# Altium schematic symbol library jlcpcb_2025_04_capacitors_extended_0402.schlib: 3594 symbols (part 7 of 20) (continued)
## CC0402CRNPO9BN8R0
designator C?  Capacitance: 8pF  (hidden comment: *)
Capacitor, Ceramic (MLCC), 8pF, 50V, NP0, SMD 0402; Manufacturer: YAGEO; Manufacturer Part Number: CC0402CRNPO9BN8R0; Package Size: 0402; JLCPCB Basic Part: No; JLCPCB Part Number: C130118; Supplier 1: LCSC; Category: Capacitors - MLCC; Supplier Part Number 1: C130118; Voltage Rating: 50V; Temperature Coefficient: NP0; RoHS: Yes; ComponentLink1Description: Datasheet; ComponentLink1URL: https://wmsc.lcsc.com/wmsc/upload/file/pdf/v2/lcsc/2304140030_YAGEO-CC0402CRNPO9BN8R0_C130118.pdf; ComponentLink2Description: JLCPCB Part URL; ComponentLink2URL: https://jlcpcb.com/partdetail/C130118; ComponentLink3Description: LCSC Part URL; ComponentLink3URL: https://lcsc.com/product-detail/Multilayer-Ceramic-Capacitors-MLCC---SMD-SMT_YAGEO-YAGEO-CC0402CRNPO9BN8R0_C130118.html
footprint CAP-0402 (0402 (1005M) Capacitor)
pins: 1, 2

## CC0402CRNPO9BN8R2
designator C?  Capacitance: 8.2pF  (hidden comment: *)
Capacitor, Ceramic (MLCC), 8.2pF, 50V, NP0, SMD 0402; Manufacturer: YAGEO; Manufacturer Part Number: CC0402CRNPO9BN8R2; Package Size: 0402; JLCPCB Basic Part: No; JLCPCB Part Number: C260529; Supplier 1: LCSC; Category: Capacitors - MLCC; Supplier Part Number 1: C260529; Voltage Rating: 50V; Temperature Coefficient: NP0; RoHS: Yes; ComponentLink1Description: Datasheet; ComponentLink1URL: https://wmsc.lcsc.com/wmsc/upload/file/pdf/v2/lcsc/1810241331_YAGEO-CC0402CRNPO9BN8R2_C260529.pdf; ComponentLink2Description: JLCPCB Part URL; ComponentLink2URL: https://jlcpcb.com/partdetail/C260529; ComponentLink3Description: LCSC Part URL; ComponentLink3URL: https://lcsc.com/product-detail/Multilayer-Ceramic-Capacitors-MLCC---SMD-SMT_YAGEO-YAGEO-CC0402CRNPO9BN8R2_C260529.html
footprint CAP-0402 (0402 (1005M) Capacitor)
pins: 1, 2

## CC0402CRNPO9BN9R0
designator C?  Capacitance: 9pF  (hidden comment: *)
Capacitor, Ceramic (MLCC), 9pF, 50V, NP0, SMD 0402; Manufacturer: YAGEO; Manufacturer Part Number: CC0402CRNPO9BN9R0; Package Size: 0402; JLCPCB Basic Part: No; JLCPCB Part Number: C282242; Supplier 1: LCSC; Category: Capacitors - MLCC; Supplier Part Number 1: C282242; Voltage Rating: 50V; Temperature Coefficient: NP0; RoHS: Yes; ComponentLink1Description: Datasheet; ComponentLink1URL: https://wmsc.lcsc.com/wmsc/upload/file/pdf/v2/lcsc/2304140030_YAGEO-CC0402CRNPO9BN9R0_C282242.pdf; ComponentLink2Description: JLCPCB Part URL; ComponentLink2URL: https://jlcpcb.com/partdetail/C282242; ComponentLink3Description: LCSC Part URL; ComponentLink3URL: https://lcsc.com/product-detail/Multilayer-Ceramic-Capacitors-MLCC---SMD-SMT_YAGEO-YAGEO-CC0402CRNPO9BN9R0_C282242.html
footprint CAP-0402 (0402 (1005M) Capacitor)
pins: 1, 2

## CC0402CRNPO9BN9R1
designator C?  Capacitance: 9.1pF  (hidden comment: *)
Capacitor, Ceramic (MLCC), 9.1pF, 50V, NP0, SMD 0402; Manufacturer: YAGEO; Manufacturer Part Number: CC0402CRNPO9BN9R1; Package Size: 0402; JLCPCB Basic Part: No; JLCPCB Part Number: C513622; Supplier 1: LCSC; Category: Capacitors - MLCC; Supplier Part Number 1: C513622; Voltage Rating: 50V; Temperature Coefficient: NP0; RoHS: Yes; ComponentLink1Description: Datasheet; ComponentLink1URL: https://wmsc.lcsc.com/wmsc/upload/file/pdf/v2/lcsc/2004231433_YAGEO-CC0402CRNPO9BN9R1_C513622.pdf; ComponentLink2Description: JLCPCB Part URL; ComponentLink2URL: https://jlcpcb.com/partdetail/C513622; ComponentLink3Description: LCSC Part URL; ComponentLink3URL: https://lcsc.com/product-detail/Multilayer-Ceramic-Capacitors-MLCC---SMD-SMT_YAGEO-YAGEO-CC0402CRNPO9BN9R1_C513622.html
footprint CAP-0402 (0402 (1005M) Capacitor)
pins: 1, 2

## CC0402CRNPO9BN100
designator C?  Capacitance: 10pF  (hidden comment: *)
Capacitor, Ceramic (MLCC), 10pF, 50V, NP0, SMD 0402; Manufacturer: YAGEO; Manufacturer Part Number: CC0402CRNPO9BN100; Package Size: 0402; JLCPCB Basic Part: No; JLCPCB Part Number: C526974; Supplier 1: LCSC; Category: Capacitors - MLCC; Supplier Part Number 1: C526974; Voltage Rating: 50V; Temperature Coefficient: NP0; RoHS: Yes; ComponentLink1Description: Datasheet; ComponentLink1URL: https://wmsc.lcsc.com/wmsc/upload/file/pdf/v2/lcsc/2005141733_YAGEO-CC0402CRNPO9BN100_C526974.pdf; ComponentLink2Description: JLCPCB Part URL; ComponentLink2URL: https://jlcpcb.com/partdetail/C526974; ComponentLink3Description: LCSC Part URL; ComponentLink3URL: https://lcsc.com/product-detail/Multilayer-Ceramic-Capacitors-MLCC---SMD-SMT_YAGEO-YAGEO-CC0402CRNPO9BN100_C526974.html
footprint CAP-0402 (0402 (1005M) Capacitor)
pins: 1, 2

## CC0402CRNPO9BNR47
designator C?  Capacitance: 0.47pF  (hidden comment: *)
Capacitor, Ceramic (MLCC), 0.47pF, 50V, NP0, SMD 0402; Manufacturer: YAGEO; Manufacturer Part Number: CC0402CRNPO9BNR47; Package Size: 0402; JLCPCB Basic Part: No; JLCPCB Part Number: C526975; Supplier 1: LCSC; Category: Capacitors - MLCC; Supplier Part Number 1: C526975; Voltage Rating: 50V; Temperature Coefficient: NP0; RoHS: Yes; ComponentLink1Description: Datasheet; ComponentLink1URL: https://wmsc.lcsc.com/wmsc/upload/file/pdf/v2/lcsc/2006031834_YAGEO-CC0402CRNPO9BNR47_C526975.pdf; ComponentLink2Description: JLCPCB Part URL; ComponentLink2URL: https://jlcpcb.com/partdetail/C526975; ComponentLink3Description: LCSC Part URL; ComponentLink3URL: https://lcsc.com/product-detail/Multilayer-Ceramic-Capacitors-MLCC---SMD-SMT_YAGEO-YAGEO-CC0402CRNPO9BNR47_C526975.html
footprint CAP-0402 (0402 (1005M) Capacitor)
pins: 1, 2

## CC0402CRNPO9BNR50
designator C?  Capacitance: 0.5pF  (hidden comment: *)
Capacitor, Ceramic (MLCC), 0.5pF, 50V, NP0, SMD 0402; Manufacturer: YAGEO; Manufacturer Part Number: CC0402CRNPO9BNR50; Package Size: 0402; JLCPCB Basic Part: No; JLCPCB Part Number: C327230; Supplier 1: LCSC; Category: Capacitors - MLCC; Supplier Part Number 1: C327230; Voltage Rating: 50V; Temperature Coefficient: NP0; RoHS: Yes; ComponentLink1Description: Datasheet; ComponentLink1URL: https://wmsc.lcsc.com/wmsc/upload/file/pdf/v2/lcsc/1811141233_YAGEO-CC0402CRNPO9BNR50_C327230.pdf; ComponentLink2Description: JLCPCB Part URL; ComponentLink2URL: https://jlcpcb.com/partdetail/C327230; ComponentLink3Description: LCSC Part URL; ComponentLink3URL: https://lcsc.com/product-detail/Multilayer-Ceramic-Capacitors-MLCC---SMD-SMT_YAGEO-YAGEO-CC0402CRNPO9BNR50_C327230.html
footprint CAP-0402 (0402 (1005M) Capacitor)
pins: 1, 2

## CC0402CRNPO9BNR56
designator C?  Capacitance: 0.56pF  (hidden comment: *)
Capacitor, Ceramic (MLCC), 0.56pF, 50V, NP0, SMD 0402; Manufacturer: YAGEO; Manufacturer Part Number: CC0402CRNPO9BNR56; Package Size: 0402; JLCPCB Basic Part: No; JLCPCB Part Number: C114396; Supplier 1: LCSC; Category: Capacitors - MLCC; Supplier Part Number 1: C114396; Voltage Rating: 50V; Temperature Coefficient: NP0; RoHS: Yes; ComponentLink1Description: Datasheet; ComponentLink1URL: https://wmsc.lcsc.com/wmsc/upload/file/pdf/v2/lcsc/2304140030_YAGEO-CC0402CRNPO9BNR56_C114396.pdf; ComponentLink2Description: JLCPCB Part URL; ComponentLink2URL: https://jlcpcb.com/partdetail/C114396; ComponentLink3Description: LCSC Part URL; ComponentLink3URL: https://lcsc.com/product-detail/Multilayer-Ceramic-Capacitors-MLCC---SMD-SMT_YAGEO-YAGEO-CC0402CRNPO9BNR56_C114396.html
footprint CAP-0402 (0402 (1005M) Capacitor)
pins: 1, 2

## CC0402CRNPO9BNR68
designator C?  Capacitance: 0.68pF  (hidden comment: *)
Capacitor, Ceramic (MLCC), 0.68pF, 50V, NP0, SMD 0402; Manufacturer: YAGEO; Manufacturer Part Number: CC0402CRNPO9BNR68; Package Size: 0402; JLCPCB Basic Part: No; JLCPCB Part Number: C281749; Supplier 1: LCSC; Category: Capacitors - MLCC; Supplier Part Number 1: C281749; Voltage Rating: 50V; Temperature Coefficient: NP0; RoHS: Yes; ComponentLink1Description: Datasheet; ComponentLink1URL: https://wmsc.lcsc.com/wmsc/upload/file/pdf/v2/lcsc/2304140030_YAGEO-CC0402CRNPO9BNR68_C281749.pdf; ComponentLink2Description: JLCPCB Part URL; ComponentLink2URL: https://jlcpcb.com/partdetail/C281749; ComponentLink3Description: LCSC Part URL; ComponentLink3URL: https://lcsc.com/product-detail/Multilayer-Ceramic-Capacitors-MLCC---SMD-SMT_YAGEO-YAGEO-CC0402CRNPO9BNR68_C281749.html
footprint CAP-0402 (0402 (1005M) Capacitor)
pins: 1, 2

## CC0402CRNPO9BNR70
designator C?  Capacitance: 0.7pF  (hidden comment: *)
Capacitor, Ceramic (MLCC), 0.7pF, 50V, NP0, SMD 0402; Manufacturer: YAGEO; Manufacturer Part Number: CC0402CRNPO9BNR70; Package Size: 0402; JLCPCB Basic Part: No; JLCPCB Part Number: C541353; Supplier 1: LCSC; Category: Capacitors - MLCC; Supplier Part Number 1: C541353; Voltage Rating: 50V; Temperature Coefficient: NP0; RoHS: Yes; ComponentLink1Description: Datasheet; ComponentLink1URL: https://wmsc.lcsc.com/wmsc/upload/file/pdf/v2/lcsc/2006151111_YAGEO-CC0402CRNPO9BNR70_C541353.pdf; ComponentLink2Description: JLCPCB Part URL; ComponentLink2URL: https://jlcpcb.com/partdetail/C541353; ComponentLink3Description: LCSC Part URL; ComponentLink3URL: https://lcsc.com/product-detail/Multilayer-Ceramic-Capacitors-MLCC---SMD-SMT_YAGEO-YAGEO-CC0402CRNPO9BNR70_C541353.html
footprint CAP-0402 (0402 (1005M) Capacitor)
pins: 1, 2

## CC0402CRNPO9BNR75
designator C?  Capacitance: 0.75pF  (hidden comment: *)
Capacitor, Ceramic (MLCC), 0.75pF, 50V, NP0, SMD 0402; Manufacturer: YAGEO; Manufacturer Part Number: CC0402CRNPO9BNR75; Package Size: 0402; JLCPCB Basic Part: No; JLCPCB Part Number: C325457; Supplier 1: LCSC; Category: Capacitors - MLCC; Supplier Part Number 1: C325457; Voltage Rating: 50V; Temperature Coefficient: NP0; RoHS: Yes; ComponentLink1Description: Datasheet; ComponentLink1URL: https://wmsc.lcsc.com/wmsc/upload/file/pdf/v2/lcsc/1811070918_YAGEO-CC0402CRNPO9BNR75_C325457.pdf; ComponentLink2Description: JLCPCB Part URL; ComponentLink2URL: https://jlcpcb.com/partdetail/C325457; ComponentLink3Description: LCSC Part URL; ComponentLink3URL: https://lcsc.com/product-detail/Multilayer-Ceramic-Capacitors-MLCC---SMD-SMT_YAGEO-YAGEO-CC0402CRNPO9BNR75_C325457.html
footprint CAP-0402 (0402 (1005M) Capacitor)
pins: 1, 2

## CC0402CRNPO9BNR80
designator C?  Capacitance: 0.8pF  (hidden comment: *)
Capacitor, Ceramic (MLCC), 0.8pF, 50V, NP0, SMD 0402; Manufacturer: YAGEO; Manufacturer Part Number: CC0402CRNPO9BNR80; Package Size: 0402; JLCPCB Basic Part: No; JLCPCB Part Number: C325458; Supplier 1: LCSC; Category: Capacitors - MLCC; Supplier Part Number 1: C325458; Voltage Rating: 50V; Temperature Coefficient: NP0; RoHS: Yes; ComponentLink1Description: Datasheet; ComponentLink1URL: https://wmsc.lcsc.com/wmsc/upload/file/pdf/v2/lcsc/1811070918_YAGEO-CC0402CRNPO9BNR80_C325458.pdf; ComponentLink2Description: JLCPCB Part URL; ComponentLink2URL: https://jlcpcb.com/partdetail/C325458; ComponentLink3Description: LCSC Part URL; ComponentLink3URL: https://lcsc.com/product-detail/Multilayer-Ceramic-Capacitors-MLCC---SMD-SMT_YAGEO-YAGEO-CC0402CRNPO9BNR80_C325458.html
footprint CAP-0402 (0402 (1005M) Capacitor)
pins: 1, 2

## CC0402CRNPO9BNR82
designator C?  Capacitance: 0.82pF  (hidden comment: *)
Capacitor, Ceramic (MLCC), 0.82pF, 50V, NP0, SMD 0402; Manufacturer: YAGEO; Manufacturer Part Number: CC0402CRNPO9BNR82; Package Size: 0402; JLCPCB Basic Part: No; JLCPCB Part Number: C541346; Supplier 1: LCSC; Category: Capacitors - MLCC; Supplier Part Number 1: C541346; Voltage Rating: 50V; Temperature Coefficient: NP0; RoHS: Yes; ComponentLink1Description: Datasheet; ComponentLink1URL: https://wmsc.lcsc.com/wmsc/upload/file/pdf/v2/lcsc/2006151111_YAGEO-CC0402CRNPO9BNR82_C541346.pdf; ComponentLink2Description: JLCPCB Part URL; ComponentLink2URL: https://jlcpcb.com/partdetail/C541346; ComponentLink3Description: LCSC Part URL; ComponentLink3URL: https://lcsc.com/product-detail/Multilayer-Ceramic-Capacitors-MLCC---SMD-SMT_YAGEO-YAGEO-CC0402CRNPO9BNR82_C541346.html
footprint CAP-0402 (0402 (1005M) Capacitor)
pins: 1, 2

## CC0402DRNPO8BN100
designator C?  Capacitance: 10pF  (hidden comment: *)
Capacitor, Ceramic (MLCC), 10pF, 25V, NP0, SMD 0402; Manufacturer: YAGEO; Manufacturer Part Number: CC0402DRNPO8BN100; Package Size: 0402; JLCPCB Basic Part: No; JLCPCB Part Number: C526976; Supplier 1: LCSC; Category: Capacitors - MLCC; Supplier Part Number 1: C526976; Voltage Rating: 25V; Temperature Coefficient: NP0; RoHS: Yes; ComponentLink1Description: Datasheet; ComponentLink1URL: https://wmsc.lcsc.com/wmsc/upload/file/pdf/v2/lcsc/2005261832_YAGEO-CC0402DRNPO8BN100_C526976.pdf; ComponentLink2Description: JLCPCB Part URL; ComponentLink2URL: https://jlcpcb.com/partdetail/C526976; ComponentLink3Description: LCSC Part URL; ComponentLink3URL: https://lcsc.com/product-detail/Multilayer-Ceramic-Capacitors-MLCC---SMD-SMT_YAGEO-YAGEO-CC0402DRNPO8BN100_C526976.html
footprint CAP-0402 (0402 (1005M) Capacitor)
pins: 1, 2

## CC0402DRNPO9BN5R0
designator C?  Capacitance: 5pF  (hidden comment: *)
Capacitor, Ceramic (MLCC), 5pF, 50V, NP0, SMD 0402; Manufacturer: YAGEO; Manufacturer Part Number: CC0402DRNPO9BN5R0; Package Size: 0402; JLCPCB Basic Part: No; JLCPCB Part Number: C281762; Supplier 1: LCSC; Category: Capacitors - MLCC; Supplier Part Number 1: C281762; Voltage Rating: 50V; Temperature Coefficient: NP0; RoHS: Yes; ComponentLink1Description: Datasheet; ComponentLink1URL: https://wmsc.lcsc.com/wmsc/upload/file/pdf/v2/lcsc/2304140030_YAGEO-CC0402DRNPO9BN5R0_C281762.pdf; ComponentLink2Description: JLCPCB Part URL; ComponentLink2URL: https://jlcpcb.com/partdetail/C281762; ComponentLink3Description: LCSC Part URL; ComponentLink3URL: https://lcsc.com/product-detail/Multilayer-Ceramic-Capacitors-MLCC---SMD-SMT_YAGEO-YAGEO-CC0402DRNPO9BN5R0_C281762.html
footprint CAP-0402 (0402 (1005M) Capacitor)
pins: 1, 2

## CC0402DRNPO9BN5R1
designator C?  Capacitance: 5.1pF  (hidden comment: *)
Capacitor, Ceramic (MLCC), 5.1pF, 50V, NP0, SMD 0402; Manufacturer: YAGEO; Manufacturer Part Number: CC0402DRNPO9BN5R1; Package Size: 0402; JLCPCB Basic Part: No; JLCPCB Part Number: C541354; Supplier 1: LCSC; Category: Capacitors - MLCC; Supplier Part Number 1: C541354; Voltage Rating: 50V; Temperature Coefficient: NP0; RoHS: Yes; ComponentLink1Description: Datasheet; ComponentLink1URL: https://wmsc.lcsc.com/wmsc/upload/file/pdf/v2/lcsc/2006151111_YAGEO-CC0402DRNPO9BN5R1_C541354.pdf; ComponentLink2Description: JLCPCB Part URL; ComponentLink2URL: https://jlcpcb.com/partdetail/C541354; ComponentLink3Description: LCSC Part URL; ComponentLink3URL: https://lcsc.com/product-detail/Multilayer-Ceramic-Capacitors-MLCC---SMD-SMT_YAGEO-YAGEO-CC0402DRNPO9BN5R1_C541354.html
footprint CAP-0402 (0402 (1005M) Capacitor)
pins: 1, 2

## CC0402DRNPO9BN5R6
designator C?  Capacitance: 5.6pF  (hidden comment: *)
Capacitor, Ceramic (MLCC), 5.6pF, 50V, NP0, SMD 0402; Manufacturer: YAGEO; Manufacturer Part Number: CC0402DRNPO9BN5R6; Package Size: 0402; JLCPCB Basic Part: No; JLCPCB Part Number: C327277; Supplier 1: LCSC; Category: Capacitors - MLCC; Supplier Part Number 1: C327277; Voltage Rating: 50V; Temperature Coefficient: NP0; RoHS: Yes; ComponentLink1Description: Datasheet; ComponentLink1URL: https://wmsc.lcsc.com/wmsc/upload/file/pdf/v2/lcsc/1912111437_YAGEO-CC0402DRNPO9BN5R6_C327277.pdf; ComponentLink2Description: JLCPCB Part URL; ComponentLink2URL: https://jlcpcb.com/partdetail/C327277; ComponentLink3Description: LCSC Part URL; ComponentLink3URL: https://lcsc.com/product-detail/Multilayer-Ceramic-Capacitors-MLCC---SMD-SMT_YAGEO-YAGEO-CC0402DRNPO9BN5R6_C327277.html
footprint CAP-0402 (0402 (1005M) Capacitor)
pins: 1, 2

## CC0402DRNPO9BN6R0
designator C?  Capacitance: 6pF  (hidden comment: *)
Capacitor, Ceramic (MLCC), 6pF, 50V, NP0, SMD 0402; Manufacturer: YAGEO; Manufacturer Part Number: CC0402DRNPO9BN6R0; Package Size: 0402; JLCPCB Basic Part: No; JLCPCB Part Number: C327293; Supplier 1: LCSC; Category: Capacitors - MLCC; Supplier Part Number 1: C327293; Voltage Rating: 50V; Temperature Coefficient: NP0; RoHS: Yes; ComponentLink1Description: Datasheet; ComponentLink1URL: https://wmsc.lcsc.com/wmsc/upload/file/pdf/v2/lcsc/1811141234_YAGEO-CC0402DRNPO9BN6R0_C327293.pdf; ComponentLink2Description: JLCPCB Part URL; ComponentLink2URL: https://jlcpcb.com/partdetail/C327293; ComponentLink3Description: LCSC Part URL; ComponentLink3URL: https://lcsc.com/product-detail/Multilayer-Ceramic-Capacitors-MLCC---SMD-SMT_YAGEO-YAGEO-CC0402DRNPO9BN6R0_C327293.html
footprint CAP-0402 (0402 (1005M) Capacitor)
pins: 1, 2

## CC0402DRNPO9BN6R2
designator C?  Capacitance: 6.2pF  (hidden comment: *)
Capacitor, Ceramic (MLCC), 6.2pF, 50V, NP0, SMD 0402; Manufacturer: YAGEO; Manufacturer Part Number: CC0402DRNPO9BN6R2; Package Size: 0402; JLCPCB Basic Part: No; JLCPCB Part Number: C541355; Supplier 1: LCSC; Category: Capacitors - MLCC; Supplier Part Number 1: C541355; Voltage Rating: 50V; Temperature Coefficient: NP0; RoHS: Yes; ComponentLink1Description: Datasheet; ComponentLink1URL: https://wmsc.lcsc.com/wmsc/upload/file/pdf/v2/lcsc/2006151111_YAGEO-CC0402DRNPO9BN6R2_C541355.pdf; ComponentLink2Description: JLCPCB Part URL; ComponentLink2URL: https://jlcpcb.com/partdetail/C541355; ComponentLink3Description: LCSC Part URL; ComponentLink3URL: https://lcsc.com/product-detail/Multilayer-Ceramic-Capacitors-MLCC---SMD-SMT_YAGEO-YAGEO-CC0402DRNPO9BN6R2_C541355.html
footprint CAP-0402 (0402 (1005M) Capacitor)
pins: 1, 2

## CC0402DRNPO9BN6R8
designator C?  Capacitance: 6.8pF  (hidden comment: *)
Capacitor, Ceramic (MLCC), 6.8pF, 50V, NP0, SMD 0402; Manufacturer: YAGEO; Manufacturer Part Number: CC0402DRNPO9BN6R8; Package Size: 0402; JLCPCB Basic Part: No; JLCPCB Part Number: C541347; Supplier 1: LCSC; Category: Capacitors - MLCC; Supplier Part Number 1: C541347; Voltage Rating: 50V; Temperature Coefficient: NP0; RoHS: Yes; ComponentLink1Description: Datasheet; ComponentLink1URL: https://wmsc.lcsc.com/wmsc/upload/file/pdf/v2/lcsc/2006151111_YAGEO-CC0402DRNPO9BN6R8_C541347.pdf; ComponentLink2Description: JLCPCB Part URL; ComponentLink2URL: https://jlcpcb.com/partdetail/C541347; ComponentLink3Description: LCSC Part URL; ComponentLink3URL: https://lcsc.com/product-detail/Multilayer-Ceramic-Capacitors-MLCC---SMD-SMT_YAGEO-YAGEO-CC0402DRNPO9BN6R8_C541347.html
footprint CAP-0402 (0402 (1005M) Capacitor)
pins: 1, 2

## CC0402DRNPO9BN7R0
designator C?  Capacitance: 7pF  (hidden comment: *)
Capacitor, Ceramic (MLCC), 7pF, 50V, NP0, SMD 0402; Manufacturer: YAGEO; Manufacturer Part Number: CC0402DRNPO9BN7R0; Package Size: 0402; JLCPCB Basic Part: No; JLCPCB Part Number: C114403; Supplier 1: LCSC; Category: Capacitors - MLCC; Supplier Part Number 1: C114403; Voltage Rating: 50V; Temperature Coefficient: NP0; RoHS: Yes; ComponentLink1Description: Datasheet; ComponentLink1URL: https://wmsc.lcsc.com/wmsc/upload/file/pdf/v2/lcsc/2304140030_YAGEO-CC0402DRNPO9BN7R0_C114403.pdf; ComponentLink2Description: JLCPCB Part URL; ComponentLink2URL: https://jlcpcb.com/partdetail/C114403; ComponentLink3Description: LCSC Part URL; ComponentLink3URL: https://lcsc.com/product-detail/Multilayer-Ceramic-Capacitors-MLCC---SMD-SMT_YAGEO-YAGEO-CC0402DRNPO9BN7R0_C114403.html
footprint CAP-0402 (0402 (1005M) Capacitor)
pins: 1, 2

## CC0402DRNPO9BN7R5
designator C?  Capacitance: 7.5pF  (hidden comment: *)
Capacitor, Ceramic (MLCC), 7.5pF, 50V, NP0, SMD 0402; Manufacturer: YAGEO; Manufacturer Part Number: CC0402DRNPO9BN7R5; Package Size: 0402; JLCPCB Basic Part: No; JLCPCB Part Number: C541356; Supplier 1: LCSC; Category: Capacitors - MLCC; Supplier Part Number 1: C541356; Voltage Rating: 50V; Temperature Coefficient: NP0; RoHS: Yes; ComponentLink1Description: Datasheet; ComponentLink1URL: https://wmsc.lcsc.com/wmsc/upload/file/pdf/v2/lcsc/2006151111_YAGEO-CC0402DRNPO9BN7R5_C541356.pdf; ComponentLink2Description: JLCPCB Part URL; ComponentLink2URL: https://jlcpcb.com/partdetail/C541356; ComponentLink3Description: LCSC Part URL; ComponentLink3URL: https://lcsc.com/product-detail/Multilayer-Ceramic-Capacitors-MLCC---SMD-SMT_YAGEO-YAGEO-CC0402DRNPO9BN7R5_C541356.html
footprint CAP-0402 (0402 (1005M) Capacitor)
pins: 1, 2

## CC0402DRNPO9BN8R0
designator C?  Capacitance: 8pF  (hidden comment: *)
Capacitor, Ceramic (MLCC), 8pF, 50V, NP0, SMD 0402; Manufacturer: YAGEO; Manufacturer Part Number: CC0402DRNPO9BN8R0; Package Size: 0402; JLCPCB Basic Part: No; JLCPCB Part Number: C327227; Supplier 1: LCSC; Category: Capacitors - MLCC; Supplier Part Number 1: C327227; Voltage Rating: 50V; Temperature Coefficient: NP0; RoHS: Yes; ComponentLink1Description: Datasheet; ComponentLink1URL: https://wmsc.lcsc.com/wmsc/upload/file/pdf/v2/lcsc/1811141224_YAGEO-CC0402DRNPO9BN8R0_C327227.pdf; ComponentLink2Description: JLCPCB Part URL; ComponentLink2URL: https://jlcpcb.com/partdetail/C327227; ComponentLink3Description: LCSC Part URL; ComponentLink3URL: https://lcsc.com/product-detail/Multilayer-Ceramic-Capacitors-MLCC---SMD-SMT_YAGEO-YAGEO-CC0402DRNPO9BN8R0_C327227.html
footprint CAP-0402 (0402 (1005M) Capacitor)
pins: 1, 2

## CC0402DRNPO9BN8R2
designator C?  Capacitance: 8.2pF  (hidden comment: *)
Capacitor, Ceramic (MLCC), 8.2pF, 50V, NP0, SMD 0402; Manufacturer: YAGEO; Manufacturer Part Number: CC0402DRNPO9BN8R2; Package Size: 0402; JLCPCB Basic Part: No; JLCPCB Part Number: C327412; Supplier 1: LCSC; Category: Capacitors - MLCC; Supplier Part Number 1: C327412; Voltage Rating: 50V; Temperature Coefficient: NP0; RoHS: Yes; ComponentLink1Description: Datasheet; ComponentLink1URL: https://wmsc.lcsc.com/wmsc/upload/file/pdf/v2/lcsc/1811141242_YAGEO-CC0402DRNPO9BN8R2_C327412.pdf; ComponentLink2Description: JLCPCB Part URL; ComponentLink2URL: https://jlcpcb.com/partdetail/C327412; ComponentLink3Description: LCSC Part URL; ComponentLink3URL: https://lcsc.com/product-detail/Multilayer-Ceramic-Capacitors-MLCC---SMD-SMT_YAGEO-YAGEO-CC0402DRNPO9BN8R2_C327412.html
footprint CAP-0402 (0402 (1005M) Capacitor)
pins: 1, 2

## CC0402DRNPO9BN9R0
designator C?  Capacitance: 9pF  (hidden comment: *)
Capacitor, Ceramic (MLCC), 9pF, 50V, NP0, SMD 0402; Manufacturer: YAGEO; Manufacturer Part Number: CC0402DRNPO9BN9R0; Package Size: 0402; JLCPCB Basic Part: No; JLCPCB Part Number: C114391; Supplier 1: LCSC; Category: Capacitors - MLCC; Supplier Part Number 1: C114391; Voltage Rating: 50V; Temperature Coefficient: NP0; RoHS: Yes; ComponentLink1Description: Datasheet; ComponentLink1URL: https://wmsc.lcsc.com/wmsc/upload/file/pdf/v2/lcsc/2304140030_YAGEO-CC0402DRNPO9BN9R0_C114391.pdf; ComponentLink2Description: JLCPCB Part URL; ComponentLink2URL: https://jlcpcb.com/partdetail/C114391; ComponentLink3Description: LCSC Part URL; ComponentLink3URL: https://lcsc.com/product-detail/Multilayer-Ceramic-Capacitors-MLCC---SMD-SMT_YAGEO-YAGEO-CC0402DRNPO9BN9R0_C114391.html
footprint CAP-0402 (0402 (1005M) Capacitor)
pins: 1, 2

## CC0402DRNPO9BN100
designator C?  Capacitance: 10pF  (hidden comment: *)
Capacitor, Ceramic (MLCC), 10pF, 50V, NP0, SMD 0402; Manufacturer: YAGEO; Manufacturer Part Number: CC0402DRNPO9BN100; Package Size: 0402; JLCPCB Basic Part: No; JLCPCB Part Number: C526977; Supplier 1: LCSC; Category: Capacitors - MLCC; Supplier Part Number 1: C526977; Voltage Rating: 50V; Temperature Coefficient: NP0; RoHS: Yes; ComponentLink1Description: Datasheet; ComponentLink1URL: https://wmsc.lcsc.com/wmsc/upload/file/pdf/v2/lcsc/2006031537_YAGEO-CC0402DRNPO9BN100_C526977.pdf; ComponentLink2Description: JLCPCB Part URL; ComponentLink2URL: https://jlcpcb.com/partdetail/C526977; ComponentLink3Description: LCSC Part URL; ComponentLink3URL: https://lcsc.com/product-detail/Multilayer-Ceramic-Capacitors-MLCC---SMD-SMT_YAGEO-YAGEO-CC0402DRNPO9BN100_C526977.html
footprint CAP-0402 (0402 (1005M) Capacitor)
pins: 1, 2

## CC0402DRNPO9BN150
designator C?  Capacitance: 15pF  (hidden comment: *)
Capacitor, Ceramic (MLCC), 15pF, 50V, NP0, SMD 0402; Manufacturer: YAGEO; Manufacturer Part Number: CC0402DRNPO9BN150; Package Size: 0402; JLCPCB Basic Part: No; JLCPCB Part Number: C526978; Supplier 1: LCSC; Category: Capacitors - MLCC; Supplier Part Number 1: C526978; Voltage Rating: 50V; Temperature Coefficient: NP0; RoHS: Yes; ComponentLink1Description: Datasheet; ComponentLink1URL: https://wmsc.lcsc.com/wmsc/upload/file/pdf/v2/lcsc/2008201233_YAGEO-CC0402DRNPO9BN150_C526978.pdf; ComponentLink2Description: JLCPCB Part URL; ComponentLink2URL: https://jlcpcb.com/partdetail/C526978; ComponentLink3Description: LCSC Part URL; ComponentLink3URL: https://lcsc.com/product-detail/Multilayer-Ceramic-Capacitors-MLCC---SMD-SMT_YAGEO-YAGEO-CC0402DRNPO9BN150_C526978.html
footprint CAP-0402 (0402 (1005M) Capacitor)
pins: 1, 2

## CC0402FRNPO8BN100
designator C?  Capacitance: 10pF  (hidden comment: *)
Capacitor, Ceramic (MLCC), 10pF, ±1%, 25V, NP0, ±1%, SMD 0402; Manufacturer: YAGEO; Manufacturer Part Number: CC0402FRNPO8BN100; Package Size: 0402; JLCPCB Basic Part: No; JLCPCB Part Number: C1853056; Supplier 1: LCSC; Category: Capacitors - MLCC; Supplier Part Number 1: C1853056; Tolerance: ±1%; Voltage Rating: 25V; Temperature Coefficient: NP0; RoHS: Yes; ComponentLink1Description: Datasheet; ComponentLink1URL: https://wmsc.lcsc.com/wmsc/upload/file/pdf/v2/lcsc/2202151130_YAGEO-CC0402FRNPO8BN100_C1853056.pdf; ComponentLink2Description: JLCPCB Part URL; ComponentLink2URL: https://jlcpcb.com/partdetail/C1853056; ComponentLink3Description: LCSC Part URL; ComponentLink3URL: https://lcsc.com/product-detail/Multilayer-Ceramic-Capacitors-MLCC---SMD-SMT_YAGEO-YAGEO-CC0402FRNPO8BN100_C1853056.html
footprint CAP-0402 (0402 (1005M) Capacitor)
pins: 1, 2

## CC0402FRNPO8BN271
designator C?  Capacitance: 270pF  (hidden comment: *)
Capacitor, Ceramic (MLCC), 270pF, ±1%, 25V, NP0, ±1%, SMD 0402; Manufacturer: YAGEO; Manufacturer Part Number: CC0402FRNPO8BN271; Package Size: 0402; JLCPCB Basic Part: No; JLCPCB Part Number: C526979; Supplier 1: LCSC; Category: Capacitors - MLCC; Supplier Part Number 1: C526979; Tolerance: ±1%; Voltage Rating: 25V; Temperature Coefficient: NP0; RoHS: Yes; ComponentLink1Description: Datasheet; ComponentLink1URL: https://wmsc.lcsc.com/wmsc/upload/file/pdf/v2/lcsc/2007221234_YAGEO-CC0402FRNPO8BN271_C526979.pdf; ComponentLink2Description: JLCPCB Part URL; ComponentLink2URL: https://jlcpcb.com/partdetail/C526979; ComponentLink3Description: LCSC Part URL; ComponentLink3URL: https://lcsc.com/product-detail/Multilayer-Ceramic-Capacitors-MLCC---SMD-SMT_YAGEO-YAGEO-CC0402FRNPO8BN271_C526979.html
footprint CAP-0402 (0402 (1005M) Capacitor)
pins: 1, 2

## CC0402FRNPO9BN100
designator C?  Capacitance: 10pF  (hidden comment: *)
Capacitor, Ceramic (MLCC), 10pF, ±1%, 50V, NP0, ±1%, SMD 0402; Manufacturer: YAGEO; Manufacturer Part Number: CC0402FRNPO9BN100; Package Size: 0402; JLCPCB Basic Part: No; JLCPCB Part Number: C513681; Supplier 1: LCSC; Category: Capacitors - MLCC; Supplier Part Number 1: C513681; Tolerance: ±1%; Voltage Rating: 50V; Temperature Coefficient: NP0; RoHS: Yes; ComponentLink1Description: Datasheet; ComponentLink1URL: https://wmsc.lcsc.com/wmsc/upload/file/pdf/v2/lcsc/2004231434_YAGEO-CC0402FRNPO9BN100_C513681.pdf; ComponentLink2Description: JLCPCB Part URL; ComponentLink2URL: https://jlcpcb.com/partdetail/C513681; ComponentLink3Description: LCSC Part URL; ComponentLink3URL: https://lcsc.com/product-detail/Multilayer-Ceramic-Capacitors-MLCC---SMD-SMT_YAGEO-YAGEO-CC0402FRNPO9BN100_C513681.html
footprint CAP-0402 (0402 (1005M) Capacitor)
pins: 1, 2

## CC0402FRNPO9BN101
designator C?  Capacitance: 100pF  (hidden comment: *)
Capacitor, Ceramic (MLCC), 100pF, ±1%, 50V, NP0, ±1%, SMD 0402; Manufacturer: YAGEO; Manufacturer Part Number: CC0402FRNPO9BN101; Package Size: 0402; JLCPCB Basic Part: No; JLCPCB Part Number: C327198; Supplier 1: LCSC; Category: Capacitors - MLCC; Supplier Part Number 1: C327198; Tolerance: ±1%; Voltage Rating: 50V; Temperature Coefficient: NP0; RoHS: Yes; ComponentLink1Description: Datasheet; ComponentLink1URL: https://wmsc.lcsc.com/wmsc/upload/file/pdf/v2/lcsc/1811141233_YAGEO-CC0402FRNPO9BN101_C327198.pdf; ComponentLink2Description: JLCPCB Part URL; ComponentLink2URL: https://jlcpcb.com/partdetail/C327198; ComponentLink3Description: LCSC Part URL; ComponentLink3URL: https://lcsc.com/product-detail/Multilayer-Ceramic-Capacitors-MLCC---SMD-SMT_YAGEO-YAGEO-CC0402FRNPO9BN101_C327198.html
footprint CAP-0402 (0402 (1005M) Capacitor)
pins: 1, 2

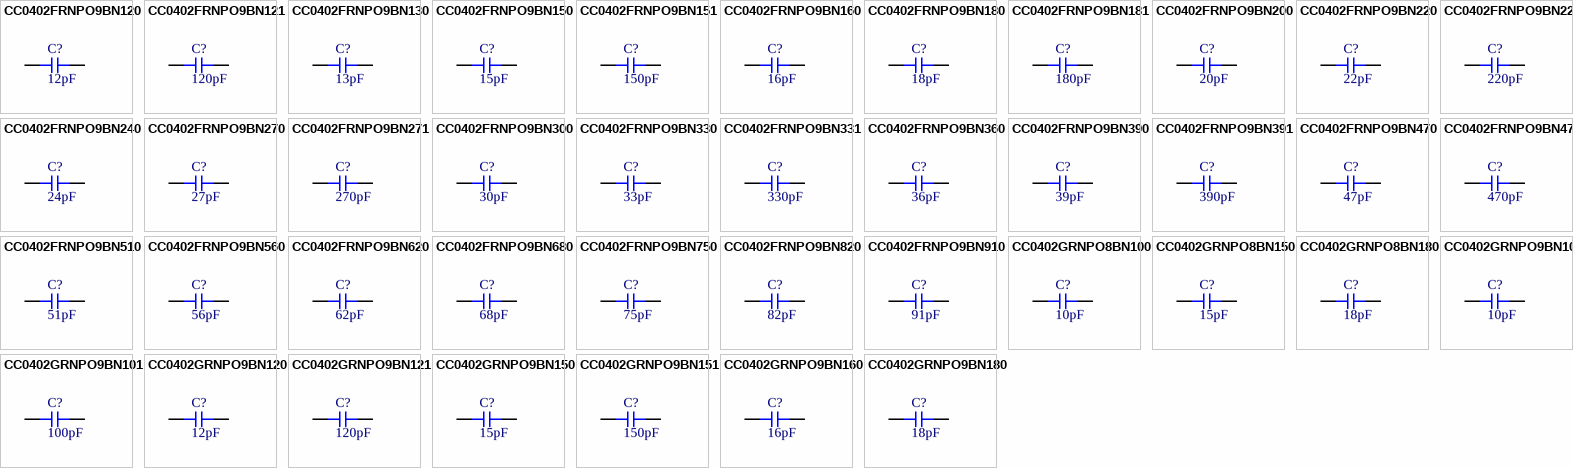
[diagram p32: symbols CC0402FRNPO9BN120 to CC0402GRNPO9BN180]

## CC0402FRNPO9BN120
designator C?  Capacitance: 12pF  (hidden comment: *)
Capacitor, Ceramic (MLCC), 12pF, ±1%, 50V, NP0, ±1%, SMD 0402; Manufacturer: YAGEO; Manufacturer Part Number: CC0402FRNPO9BN120; Package Size: 0402; JLCPCB Basic Part: No; JLCPCB Part Number: C326662; Supplier 1: LCSC; Category: Capacitors - MLCC; Supplier Part Number 1: C326662; Tolerance: ±1%; Voltage Rating: 50V; Temperature Coefficient: NP0; RoHS: Yes; ComponentLink1Description: Datasheet; ComponentLink1URL: https://wmsc.lcsc.com/wmsc/upload/file/pdf/v2/lcsc/1811141232_YAGEO-CC0402FRNPO9BN120_C326662.pdf; ComponentLink2Description: JLCPCB Part URL; ComponentLink2URL: https://jlcpcb.com/partdetail/C326662; ComponentLink3Description: LCSC Part URL; ComponentLink3URL: https://lcsc.com/product-detail/Multilayer-Ceramic-Capacitors-MLCC---SMD-SMT_YAGEO-YAGEO-CC0402FRNPO9BN120_C326662.html
footprint CAP-0402 (0402 (1005M) Capacitor)
pins: 1, 2

## CC0402FRNPO9BN121
designator C?  Capacitance: 120pF  (hidden comment: *)
Capacitor, Ceramic (MLCC), 120pF, ±1%, 50V, NP0, ±1%, SMD 0402; Manufacturer: YAGEO; Manufacturer Part Number: CC0402FRNPO9BN121; Package Size: 0402; JLCPCB Basic Part: No; JLCPCB Part Number: C541468; Supplier 1: LCSC; Category: Capacitors - MLCC; Supplier Part Number 1: C541468; Tolerance: ±1%; Voltage Rating: 50V; Temperature Coefficient: NP0; RoHS: Yes; ComponentLink1Description: Datasheet; ComponentLink1URL: https://wmsc.lcsc.com/wmsc/upload/file/pdf/v2/lcsc/2006151139_YAGEO-CC0402FRNPO9BN121_C541468.pdf; ComponentLink2Description: JLCPCB Part URL; ComponentLink2URL: https://jlcpcb.com/partdetail/C541468; ComponentLink3Description: LCSC Part URL; ComponentLink3URL: https://lcsc.com/product-detail/Multilayer-Ceramic-Capacitors-MLCC---SMD-SMT_YAGEO-YAGEO-CC0402FRNPO9BN121_C541468.html
footprint CAP-0402 (0402 (1005M) Capacitor)
pins: 1, 2

## CC0402FRNPO9BN130
designator C?  Capacitance: 13pF  (hidden comment: *)
Capacitor, Ceramic (MLCC), 13pF, 50V, NP0, SMD 0402; Manufacturer: YAGEO; Manufacturer Part Number: CC0402FRNPO9BN130; Package Size: 0402; JLCPCB Basic Part: No; JLCPCB Part Number: C541433; Supplier 1: LCSC; Category: Capacitors - MLCC; Supplier Part Number 1: C541433; Voltage Rating: 50V; Temperature Coefficient: NP0; RoHS: Yes; ComponentLink1Description: Datasheet; ComponentLink1URL: https://wmsc.lcsc.com/wmsc/upload/file/pdf/v2/lcsc/2006151135_YAGEO-CC0402FRNPO9BN130_C541433.pdf; ComponentLink2Description: JLCPCB Part URL; ComponentLink2URL: https://jlcpcb.com/partdetail/C541433; ComponentLink3Description: LCSC Part URL; ComponentLink3URL: https://lcsc.com/product-detail/Multilayer-Ceramic-Capacitors-MLCC---SMD-SMT_YAGEO-YAGEO-CC0402FRNPO9BN130_C541433.html
footprint CAP-0402 (0402 (1005M) Capacitor)
pins: 1, 2

## CC0402FRNPO9BN150
designator C?  Capacitance: 15pF  (hidden comment: *)
Capacitor, Ceramic (MLCC), 15pF, ±1%, 50V, NP0, ±1%, SMD 0402; Manufacturer: YAGEO; Manufacturer Part Number: CC0402FRNPO9BN150; Package Size: 0402; JLCPCB Basic Part: No; JLCPCB Part Number: C326803; Supplier 1: LCSC; Category: Capacitors - MLCC; Supplier Part Number 1: C326803; Tolerance: ±1%; Voltage Rating: 50V; Temperature Coefficient: NP0; RoHS: Yes; ComponentLink1Description: Datasheet; ComponentLink1URL: https://wmsc.lcsc.com/wmsc/upload/file/pdf/v2/lcsc/1811141241_YAGEO-CC0402FRNPO9BN150_C326803.pdf; ComponentLink2Description: JLCPCB Part URL; ComponentLink2URL: https://jlcpcb.com/partdetail/C326803; ComponentLink3Description: LCSC Part URL; ComponentLink3URL: https://lcsc.com/product-detail/Multilayer-Ceramic-Capacitors-MLCC---SMD-SMT_YAGEO-YAGEO-CC0402FRNPO9BN150_C326803.html
footprint CAP-0402 (0402 (1005M) Capacitor)
pins: 1, 2

## CC0402FRNPO9BN151
designator C?  Capacitance: 150pF  (hidden comment: *)
Capacitor, Ceramic (MLCC), 150pF, ±1%, 50V, NP0, ±1%, SMD 0402; Manufacturer: YAGEO; Manufacturer Part Number: CC0402FRNPO9BN151; Package Size: 0402; JLCPCB Basic Part: No; JLCPCB Part Number: C541469; Supplier 1: LCSC; Category: Capacitors - MLCC; Supplier Part Number 1: C541469; Tolerance: ±1%; Voltage Rating: 50V; Temperature Coefficient: NP0; RoHS: Yes; ComponentLink1Description: Datasheet; ComponentLink1URL: https://wmsc.lcsc.com/wmsc/upload/file/pdf/v2/lcsc/2006151139_YAGEO-CC0402FRNPO9BN151_C541469.pdf; ComponentLink2Description: JLCPCB Part URL; ComponentLink2URL: https://jlcpcb.com/partdetail/C541469; ComponentLink3Description: LCSC Part URL; ComponentLink3URL: https://lcsc.com/product-detail/Multilayer-Ceramic-Capacitors-MLCC---SMD-SMT_YAGEO-YAGEO-CC0402FRNPO9BN151_C541469.html
footprint CAP-0402 (0402 (1005M) Capacitor)
pins: 1, 2

## CC0402FRNPO9BN160
designator C?  Capacitance: 16pF  (hidden comment: *)
Capacitor, Ceramic (MLCC), 16pF, ±1%, 50V, NP0, ±1%, SMD 0402; Manufacturer: YAGEO; Manufacturer Part Number: CC0402FRNPO9BN160; Package Size: 0402; JLCPCB Basic Part: No; JLCPCB Part Number: C541434; Supplier 1: LCSC; Category: Capacitors - MLCC; Supplier Part Number 1: C541434; Tolerance: ±1%; Voltage Rating: 50V; Temperature Coefficient: NP0; RoHS: Yes; ComponentLink1Description: Datasheet; ComponentLink1URL: https://wmsc.lcsc.com/wmsc/upload/file/pdf/v2/lcsc/2006151135_YAGEO-CC0402FRNPO9BN160_C541434.pdf; ComponentLink2Description: JLCPCB Part URL; ComponentLink2URL: https://jlcpcb.com/partdetail/C541434; ComponentLink3Description: LCSC Part URL; ComponentLink3URL: https://lcsc.com/product-detail/Multilayer-Ceramic-Capacitors-MLCC---SMD-SMT_YAGEO-YAGEO-CC0402FRNPO9BN160_C541434.html
footprint CAP-0402 (0402 (1005M) Capacitor)
pins: 1, 2

## CC0402FRNPO9BN180
designator C?  Capacitance: 18pF  (hidden comment: *)
Capacitor, Ceramic (MLCC), 18pF, ±1%, 50V, NP0, ±1%, SMD 0402; Manufacturer: YAGEO; Manufacturer Part Number: CC0402FRNPO9BN180; Package Size: 0402; JLCPCB Basic Part: No; JLCPCB Part Number: C541431; Supplier 1: LCSC; Category: Capacitors - MLCC; Supplier Part Number 1: C541431; Tolerance: ±1%; Voltage Rating: 50V; Temperature Coefficient: NP0; RoHS: Yes; ComponentLink1Description: Datasheet; ComponentLink1URL: https://wmsc.lcsc.com/wmsc/upload/file/pdf/v2/lcsc/2006151135_YAGEO-CC0402FRNPO9BN180_C541431.pdf; ComponentLink2Description: JLCPCB Part URL; ComponentLink2URL: https://jlcpcb.com/partdetail/C541431; ComponentLink3Description: LCSC Part URL; ComponentLink3URL: https://lcsc.com/product-detail/Multilayer-Ceramic-Capacitors-MLCC---SMD-SMT_YAGEO-YAGEO-CC0402FRNPO9BN180_C541431.html
footprint CAP-0402 (0402 (1005M) Capacitor)
pins: 1, 2

## CC0402FRNPO9BN181
designator C?  Capacitance: 180pF  (hidden comment: *)
Capacitor, Ceramic (MLCC), 180pF, ±1%, 50V, NP0, ±1%, SMD 0402; Manufacturer: YAGEO; Manufacturer Part Number: CC0402FRNPO9BN181; Package Size: 0402; JLCPCB Basic Part: No; JLCPCB Part Number: C541470; Supplier 1: LCSC; Category: Capacitors - MLCC; Supplier Part Number 1: C541470; Tolerance: ±1%; Voltage Rating: 50V; Temperature Coefficient: NP0; RoHS: Yes; ComponentLink1Description: Datasheet; ComponentLink1URL: https://wmsc.lcsc.com/wmsc/upload/file/pdf/v2/lcsc/2006151139_YAGEO-CC0402FRNPO9BN181_C541470.pdf; ComponentLink2Description: JLCPCB Part URL; ComponentLink2URL: https://jlcpcb.com/partdetail/C541470; ComponentLink3Description: LCSC Part URL; ComponentLink3URL: https://lcsc.com/product-detail/Multilayer-Ceramic-Capacitors-MLCC---SMD-SMT_YAGEO-YAGEO-CC0402FRNPO9BN181_C541470.html
footprint CAP-0402 (0402 (1005M) Capacitor)
pins: 1, 2

## CC0402FRNPO9BN200
designator C?  Capacitance: 20pF  (hidden comment: *)
Capacitor, Ceramic (MLCC), 20pF, ±1%, 50V, NP0, ±1%, SMD 0402; Manufacturer: YAGEO; Manufacturer Part Number: CC0402FRNPO9BN200; Package Size: 0402; JLCPCB Basic Part: No; JLCPCB Part Number: C327010; Supplier 1: LCSC; Category: Capacitors - MLCC; Supplier Part Number 1: C327010; Tolerance: ±1%; Voltage Rating: 50V; Temperature Coefficient: NP0; RoHS: Yes; ComponentLink1Description: Datasheet; ComponentLink1URL: https://wmsc.lcsc.com/wmsc/upload/file/pdf/v2/lcsc/1811141241_YAGEO-CC0402FRNPO9BN200_C327010.pdf; ComponentLink2Description: JLCPCB Part URL; ComponentLink2URL: https://jlcpcb.com/partdetail/C327010; ComponentLink3Description: LCSC Part URL; ComponentLink3URL: https://lcsc.com/product-detail/Multilayer-Ceramic-Capacitors-MLCC---SMD-SMT_YAGEO-YAGEO-CC0402FRNPO9BN200_C327010.html
footprint CAP-0402 (0402 (1005M) Capacitor)
pins: 1, 2

## CC0402FRNPO9BN220
designator C?  Capacitance: 22pF  (hidden comment: *)
Capacitor, Ceramic (MLCC), 22pF, ±1%, 50V, NP0, ±1%, SMD 0402; Manufacturer: YAGEO; Manufacturer Part Number: CC0402FRNPO9BN220; Package Size: 0402; JLCPCB Basic Part: No; JLCPCB Part Number: C277482; Supplier 1: LCSC; Category: Capacitors - MLCC; Supplier Part Number 1: C277482; Tolerance: ±1%; Voltage Rating: 50V; Temperature Coefficient: NP0; RoHS: Yes; ComponentLink1Description: Datasheet; ComponentLink1URL: https://wmsc.lcsc.com/wmsc/upload/file/pdf/v2/lcsc/2304140030_YAGEO-CC0402FRNPO9BN220_C277482.pdf; ComponentLink2Description: JLCPCB Part URL; ComponentLink2URL: https://jlcpcb.com/partdetail/C277482; ComponentLink3Description: LCSC Part URL; ComponentLink3URL: https://lcsc.com/product-detail/Multilayer-Ceramic-Capacitors-MLCC---SMD-SMT_YAGEO-YAGEO-CC0402FRNPO9BN220_C277482.html
footprint CAP-0402 (0402 (1005M) Capacitor)
pins: 1, 2

## CC0402FRNPO9BN221
designator C?  Capacitance: 220pF  (hidden comment: *)
Capacitor, Ceramic (MLCC), 220pF, ±1%, 50V, NP0, ±1%, SMD 0402; Manufacturer: YAGEO; Manufacturer Part Number: CC0402FRNPO9BN221; Package Size: 0402; JLCPCB Basic Part: No; JLCPCB Part Number: C326765; Supplier 1: LCSC; Category: Capacitors - MLCC; Supplier Part Number 1: C326765; Tolerance: ±1%; Voltage Rating: 50V; Temperature Coefficient: NP0; RoHS: Yes; ComponentLink1Description: Datasheet; ComponentLink1URL: https://wmsc.lcsc.com/wmsc/upload/file/pdf/v2/lcsc/2304140030_YAGEO-CC0402FRNPO9BN221_C326765.pdf; ComponentLink2Description: JLCPCB Part URL; ComponentLink2URL: https://jlcpcb.com/partdetail/C326765; ComponentLink3Description: LCSC Part URL; ComponentLink3URL: https://lcsc.com/product-detail/Multilayer-Ceramic-Capacitors-MLCC---SMD-SMT_YAGEO-YAGEO-CC0402FRNPO9BN221_C326765.html
footprint CAP-0402 (0402 (1005M) Capacitor)
pins: 1, 2

## CC0402FRNPO9BN240
designator C?  Capacitance: 24pF  (hidden comment: *)
Capacitor, Ceramic (MLCC), 24pF, 50V, NP0, SMD 0402; Manufacturer: YAGEO; Manufacturer Part Number: CC0402FRNPO9BN240; Package Size: 0402; JLCPCB Basic Part: No; JLCPCB Part Number: C541435; Supplier 1: LCSC; Category: Capacitors - MLCC; Supplier Part Number 1: C541435; Voltage Rating: 50V; Temperature Coefficient: NP0; RoHS: Yes; ComponentLink1Description: Datasheet; ComponentLink1URL: https://wmsc.lcsc.com/wmsc/upload/file/pdf/v2/lcsc/2006151135_YAGEO-CC0402FRNPO9BN240_C541435.pdf; ComponentLink2Description: JLCPCB Part URL; ComponentLink2URL: https://jlcpcb.com/partdetail/C541435; ComponentLink3Description: LCSC Part URL; ComponentLink3URL: https://lcsc.com/product-detail/Multilayer-Ceramic-Capacitors-MLCC---SMD-SMT_YAGEO-YAGEO-CC0402FRNPO9BN240_C541435.html
footprint CAP-0402 (0402 (1005M) Capacitor)
pins: 1, 2

## CC0402FRNPO9BN270
designator C?  Capacitance: 27pF  (hidden comment: *)
Capacitor, Ceramic (MLCC), 27pF, ±1%, 50V, NP0, ±1%, SMD 0402; Manufacturer: YAGEO; Manufacturer Part Number: CC0402FRNPO9BN270; Package Size: 0402; JLCPCB Basic Part: No; JLCPCB Part Number: C277506; Supplier 1: LCSC; Category: Capacitors - MLCC; Supplier Part Number 1: C277506; Tolerance: ±1%; Voltage Rating: 50V; Temperature Coefficient: NP0; RoHS: Yes; ComponentLink1Description: Datasheet; ComponentLink1URL: https://wmsc.lcsc.com/wmsc/upload/file/pdf/v2/lcsc/2304140030_YAGEO-CC0402FRNPO9BN270_C277506.pdf; ComponentLink2Description: JLCPCB Part URL; ComponentLink2URL: https://jlcpcb.com/partdetail/C277506; ComponentLink3Description: LCSC Part URL; ComponentLink3URL: https://lcsc.com/product-detail/Multilayer-Ceramic-Capacitors-MLCC---SMD-SMT_YAGEO-YAGEO-CC0402FRNPO9BN270_C277506.html
footprint CAP-0402 (0402 (1005M) Capacitor)
pins: 1, 2

## CC0402FRNPO9BN271
designator C?  Capacitance: 270pF  (hidden comment: *)
Capacitor, Ceramic (MLCC), 270pF, 50V, NP0, SMD 0402; Manufacturer: YAGEO; Manufacturer Part Number: CC0402FRNPO9BN271; Package Size: 0402; JLCPCB Basic Part: No; JLCPCB Part Number: C541471; Supplier 1: LCSC; Category: Capacitors - MLCC; Supplier Part Number 1: C541471; Voltage Rating: 50V; Temperature Coefficient: NP0; RoHS: Yes; ComponentLink1Description: Datasheet; ComponentLink1URL: https://wmsc.lcsc.com/wmsc/upload/file/pdf/v2/lcsc/2006151139_YAGEO-CC0402FRNPO9BN271_C541471.pdf; ComponentLink2Description: JLCPCB Part URL; ComponentLink2URL: https://jlcpcb.com/partdetail/C541471; ComponentLink3Description: LCSC Part URL; ComponentLink3URL: https://lcsc.com/product-detail/Multilayer-Ceramic-Capacitors-MLCC---SMD-SMT_YAGEO-YAGEO-CC0402FRNPO9BN271_C541471.html
footprint CAP-0402 (0402 (1005M) Capacitor)
pins: 1, 2

## CC0402FRNPO9BN300
designator C?  Capacitance: 30pF  (hidden comment: *)
Capacitor, Ceramic (MLCC), 30pF, ±1%, 50V, NP0, ±1%, SMD 0402; Manufacturer: YAGEO; Manufacturer Part Number: CC0402FRNPO9BN300; Package Size: 0402; JLCPCB Basic Part: No; JLCPCB Part Number: C526980; Supplier 1: LCSC; Category: Capacitors - MLCC; Supplier Part Number 1: C526980; Tolerance: ±1%; Voltage Rating: 50V; Temperature Coefficient: NP0; RoHS: Yes; ComponentLink1Description: Datasheet; ComponentLink1URL: https://wmsc.lcsc.com/wmsc/upload/file/pdf/v2/lcsc/2005222139_YAGEO-CC0402FRNPO9BN300_C526980.pdf; ComponentLink2Description: JLCPCB Part URL; ComponentLink2URL: https://jlcpcb.com/partdetail/C526980; ComponentLink3Description: LCSC Part URL; ComponentLink3URL: https://lcsc.com/product-detail/Multilayer-Ceramic-Capacitors-MLCC---SMD-SMT_YAGEO-YAGEO-CC0402FRNPO9BN300_C526980.html
footprint CAP-0402 (0402 (1005M) Capacitor)
pins: 1, 2

## CC0402FRNPO9BN330
designator C?  Capacitance: 33pF  (hidden comment: *)
Capacitor, Ceramic (MLCC), 33pF, ±1%, 50V, NP0, ±1%, SMD 0402; Manufacturer: YAGEO; Manufacturer Part Number: CC0402FRNPO9BN330; Package Size: 0402; JLCPCB Basic Part: No; JLCPCB Part Number: C327064; Supplier 1: LCSC; Category: Capacitors - MLCC; Supplier Part Number 1: C327064; Tolerance: ±1%; Voltage Rating: 50V; Temperature Coefficient: NP0; RoHS: Yes; ComponentLink1Description: Datasheet; ComponentLink1URL: https://wmsc.lcsc.com/wmsc/upload/file/pdf/v2/lcsc/1811141240_YAGEO-CC0402FRNPO9BN330_C327064.pdf; ComponentLink2Description: JLCPCB Part URL; ComponentLink2URL: https://jlcpcb.com/partdetail/C327064; ComponentLink3Description: LCSC Part URL; ComponentLink3URL: https://lcsc.com/product-detail/Multilayer-Ceramic-Capacitors-MLCC---SMD-SMT_YAGEO-YAGEO-CC0402FRNPO9BN330_C327064.html
footprint CAP-0402 (0402 (1005M) Capacitor)
pins: 1, 2

## CC0402FRNPO9BN331
designator C?  Capacitance: 330pF  (hidden comment: *)
Capacitor, Ceramic (MLCC), 330pF, 50V, NP0, SMD 0402; Manufacturer: YAGEO; Manufacturer Part Number: CC0402FRNPO9BN331; Package Size: 0402; JLCPCB Basic Part: No; JLCPCB Part Number: C541473; Supplier 1: LCSC; Category: Capacitors - MLCC; Supplier Part Number 1: C541473; Voltage Rating: 50V; Temperature Coefficient: NP0; RoHS: Yes; ComponentLink1Description: Datasheet; ComponentLink1URL: https://wmsc.lcsc.com/wmsc/upload/file/pdf/v2/lcsc/2006151139_YAGEO-CC0402FRNPO9BN331_C541473.pdf; ComponentLink2Description: JLCPCB Part URL; ComponentLink2URL: https://jlcpcb.com/partdetail/C541473; ComponentLink3Description: LCSC Part URL; ComponentLink3URL: https://lcsc.com/product-detail/Multilayer-Ceramic-Capacitors-MLCC---SMD-SMT_YAGEO-YAGEO-CC0402FRNPO9BN331_C541473.html
footprint CAP-0402 (0402 (1005M) Capacitor)
pins: 1, 2

## CC0402FRNPO9BN360
designator C?  Capacitance: 36pF  (hidden comment: *)
Capacitor, Ceramic (MLCC), 36pF, 50V, NP0, SMD 0402; Manufacturer: YAGEO; Manufacturer Part Number: CC0402FRNPO9BN360; Package Size: 0402; JLCPCB Basic Part: No; JLCPCB Part Number: C541436; Supplier 1: LCSC; Category: Capacitors - MLCC; Supplier Part Number 1: C541436; Voltage Rating: 50V; Temperature Coefficient: NP0; RoHS: Yes; ComponentLink1Description: Datasheet; ComponentLink1URL: https://wmsc.lcsc.com/wmsc/upload/file/pdf/v2/lcsc/2006151135_YAGEO-CC0402FRNPO9BN360_C541436.pdf; ComponentLink2Description: JLCPCB Part URL; ComponentLink2URL: https://jlcpcb.com/partdetail/C541436; ComponentLink3Description: LCSC Part URL; ComponentLink3URL: https://lcsc.com/product-detail/Multilayer-Ceramic-Capacitors-MLCC---SMD-SMT_YAGEO-YAGEO-CC0402FRNPO9BN360_C541436.html
footprint CAP-0402 (0402 (1005M) Capacitor)
pins: 1, 2

## CC0402FRNPO9BN390
designator C?  Capacitance: 39pF  (hidden comment: *)
Capacitor, Ceramic (MLCC), 39pF, ±1%, 50V, NP0, ±1%, SMD 0402; Manufacturer: YAGEO; Manufacturer Part Number: CC0402FRNPO9BN390; Package Size: 0402; JLCPCB Basic Part: No; JLCPCB Part Number: C327068; Supplier 1: LCSC; Category: Capacitors - MLCC; Supplier Part Number 1: C327068; Tolerance: ±1%; Voltage Rating: 50V; Temperature Coefficient: NP0; RoHS: Yes; ComponentLink1Description: Datasheet; ComponentLink1URL: https://wmsc.lcsc.com/wmsc/upload/file/pdf/v2/lcsc/2304140030_YAGEO-CC0402FRNPO9BN390_C327068.pdf; ComponentLink2Description: JLCPCB Part URL; ComponentLink2URL: https://jlcpcb.com/partdetail/C327068; ComponentLink3Description: LCSC Part URL; ComponentLink3URL: https://lcsc.com/product-detail/Multilayer-Ceramic-Capacitors-MLCC---SMD-SMT_YAGEO-YAGEO-CC0402FRNPO9BN390_C327068.html
footprint CAP-0402 (0402 (1005M) Capacitor)
pins: 1, 2

## CC0402FRNPO9BN391
designator C?  Capacitance: 390pF  (hidden comment: *)
Capacitor, Ceramic (MLCC), 390pF, 50V, NP0, SMD 0402; Manufacturer: YAGEO; Manufacturer Part Number: CC0402FRNPO9BN391; Package Size: 0402; JLCPCB Basic Part: No; JLCPCB Part Number: C541474; Supplier 1: LCSC; Category: Capacitors - MLCC; Supplier Part Number 1: C541474; Voltage Rating: 50V; Temperature Coefficient: NP0; RoHS: Yes; ComponentLink1Description: Datasheet; ComponentLink1URL: https://wmsc.lcsc.com/wmsc/upload/file/pdf/v2/lcsc/2006151139_YAGEO-CC0402FRNPO9BN391_C541474.pdf; ComponentLink2Description: JLCPCB Part URL; ComponentLink2URL: https://jlcpcb.com/partdetail/C541474; ComponentLink3Description: LCSC Part URL; ComponentLink3URL: https://lcsc.com/product-detail/Multilayer-Ceramic-Capacitors-MLCC---SMD-SMT_YAGEO-YAGEO-CC0402FRNPO9BN391_C541474.html
footprint CAP-0402 (0402 (1005M) Capacitor)
pins: 1, 2